# Altium footprint library Connector_Samtec_HLE_SMD.PcbLib: 290 footprints (part 11 of 24)
Each footprint in its own frame and in the unit in brackets; x right, y up, seen from the top. Pads: shape width x height; smd on the part's side, far side on the other; paste and mask are expansions set on the pad; w line width, h text height; cw(c..) or ccw(c..) is an arc to the next point about the centre after c.
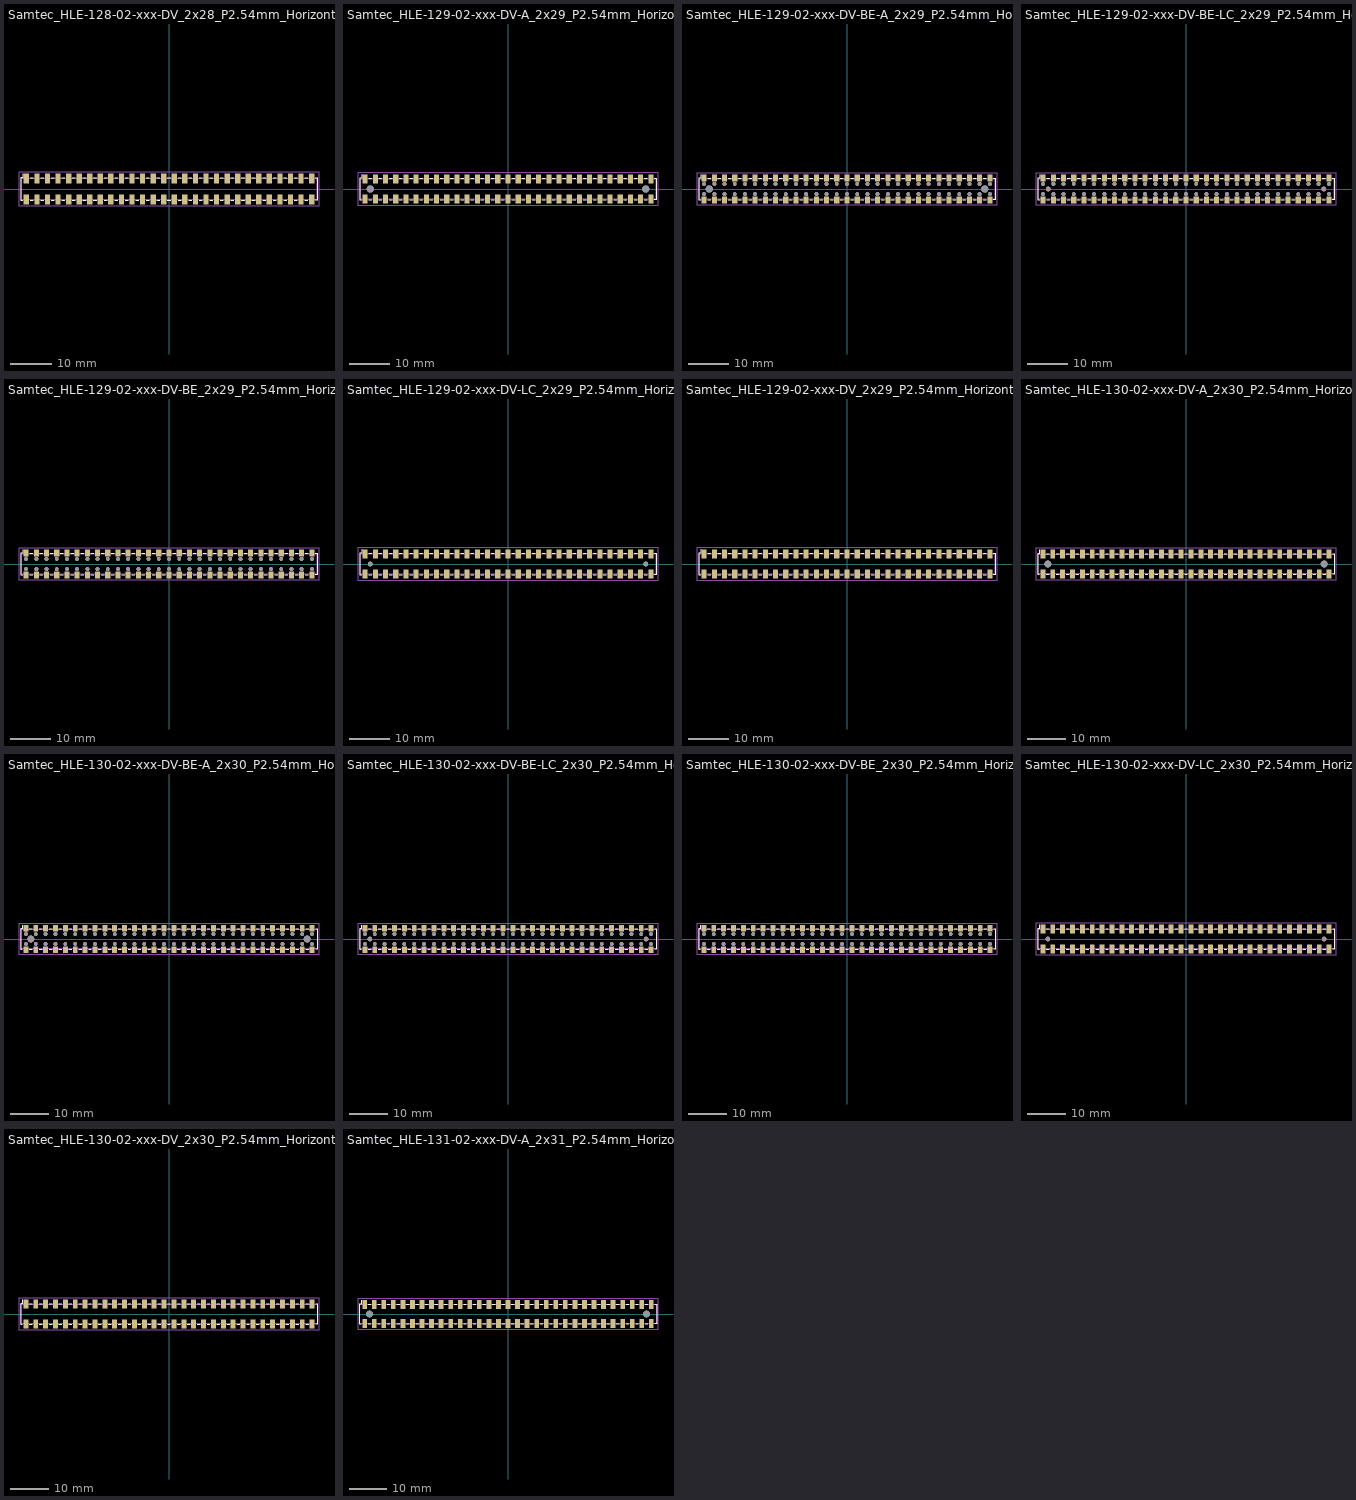
[diagram p10: the footprints below, top view; thin cyan lines are the x and y axes]

## Samtec_HLE-128-02-xxx-DV_2x28_P2.54mm_Horizontal [mm]
pads (56):
  rect 1.27x2.29 smd: 1(-34.29,2.525) 2(-34.29,-2.525) 3(-31.75,2.525) 4(-31.75,-2.525) 5(-29.21,2.525) 6(-29.21,-2.525) 7(-26.67,2.525) 8(-26.67,-2.525) 9(-24.13,2.525) 10(-24.13,-2.525) 11(-21.59,2.525) 12(-21.59,-2.525) 13(-19.05,2.525) 14(-19.05,-2.525) 15(-16.51,2.525) 16(-16.51,-2.525) 17(-13.97,2.525) 18(-13.97,-2.525) 19(-11.43,2.525) 20(-11.43,-2.525) 21(-8.89,2.525) 22(-8.89,-2.525) 23(-6.35,2.525) 24(-6.35,-2.525) 25(-3.81,2.525) 26(-3.81,-2.525) 27(-1.27,2.525) 28(-1.27,-2.525) 29(1.27,2.525) 30(1.27,-2.525) 31(3.81,2.525) 32(3.81,-2.525) 33(6.35,2.525) 34(6.35,-2.525) 35(8.89,2.525) 36(8.89,-2.525) 37(11.43,2.525) 38(11.43,-2.525) 39(13.97,2.525) 40(13.97,-2.525) 41(16.51,2.525) 42(16.51,-2.525) 43(19.05,2.525) 44(19.05,-2.525) 45(21.59,2.525) 46(21.59,-2.525) 47(24.13,2.525) 48(24.13,-2.525) 49(26.67,2.525) 50(26.67,-2.525) 51(29.21,2.525) 52(29.21,-2.525) 53(31.75,2.525) 54(31.75,-2.525) 55(34.29,2.525) 56(34.29,-2.525)
F.SilkS:
  lines w0.12: -35.185,-2.65 -35.67,-2.65 -35.67,2.65 -35.185,2.65 -35.185,3.67 ; -33.395,-2.65 -32.645,-2.65 ; -33.395,2.65 -32.645,2.65 ; -30.855,-2.65 -30.105,-2.65 ; -30.855,2.65 -30.105,2.65 ; -28.315,-2.65 -27.565,-2.65 ; -28.315,2.65 -27.565,2.65 ; -25.775,-2.65 -25.025,-2.65 ; -25.775,2.65 -25.025,2.65 ; -23.235,-2.65 -22.485,-2.65 ; -23.235,2.65 -22.485,2.65 ; -20.695,-2.65 -19.945,-2.65 ; -20.695,2.65 -19.945,2.65 ; -18.155,-2.65 -17.405,-2.65 ; -18.155,2.65 -17.405,2.65 ; -15.615,-2.65 -14.865,-2.65 ; -15.615,2.65 -14.865,2.65 ; -13.075,-2.65 -12.325,-2.65 ; -13.075,2.65 -12.325,2.65 ; -10.535,-2.65 -9.785,-2.65 ; -10.535,2.65 -9.785,2.65 ; -7.995,-2.65 -7.245,-2.65 ; -7.995,2.65 -7.245,2.65 ; -5.455,-2.65 -4.705,-2.65 ; -5.455,2.65 -4.705,2.65 ; -2.915,-2.65 -2.165,-2.65 ; -2.915,2.65 -2.165,2.65 ; -0.375,-2.65 0.375,-2.65 ; -0.375,2.65 0.375,2.65 ; 2.165,-2.65 2.915,-2.65 ; 2.165,2.65 2.915,2.65 ; 4.705,-2.65 5.455,-2.65 ; 4.705,2.65 5.455,2.65 ; 7.245,-2.65 7.995,-2.65 ; 7.245,2.65 7.995,2.65 ; 9.785,-2.65 10.535,-2.65 ; 9.785,2.65 10.535,2.65 ; 12.325,-2.65 13.075,-2.65 ; 12.325,2.65 13.075,2.65 ; 14.865,-2.65 15.615,-2.65 ; 14.865,2.65 15.615,2.65 ; 17.405,-2.65 18.155,-2.65 ; 17.405,2.65 18.155,2.65 ; 19.945,-2.65 20.695,-2.65 ; 19.945,2.65 20.695,2.65 ; 22.485,-2.65 23.235,-2.65 ; 22.485,2.65 23.235,2.65 ; 25.025,-2.65 25.775,-2.65 ; 25.025,2.65 25.775,2.65 ; 27.565,-2.65 28.315,-2.65 ; 27.565,2.65 28.315,2.65 ; 30.105,-2.65 30.855,-2.65 ; 30.105,2.65 30.855,2.65 ; 32.645,-2.65 33.395,-2.65 ; 32.645,2.65 33.395,2.65 ; 35.185,-2.65 35.67,-2.65 35.67,2.65 35.185,2.65
F.CrtYd:
  lines w0.05: -36.06,-4.17 -36.06,4.17 36.06,4.17 36.06,-4.17 -36.06,-4.17
F.Fab:
  lines w0.1: -34.79,2.54 -34.29,1.833 -33.79,2.54 ; -35.56,-2.54 35.56,-2.54 35.56,2.54 -35.56,2.54 -35.56,-2.54
  text "'.Designator'" at -4.047,-2.68 h1

## Samtec_HLE-129-02-xxx-DV-A_2x29_P2.54mm_Horizontal [mm]
pads (60):
  rect 1.27x2.29 smd: 1(-35.56,2.525) 2(-35.56,-2.525) 3(-33.02,2.525) 4(-33.02,-2.525) 5(-30.48,2.525) 6(-30.48,-2.525) 7(-27.94,2.525) 8(-27.94,-2.525) 9(-25.4,2.525) 10(-25.4,-2.525) 11(-22.86,2.525) 12(-22.86,-2.525) 13(-20.32,2.525) 14(-20.32,-2.525) 15(-17.78,2.525) 16(-17.78,-2.525) 17(-15.24,2.525) 18(-15.24,-2.525) 19(-12.7,2.525) 20(-12.7,-2.525) 21(-10.16,2.525) 22(-10.16,-2.525) 23(-7.62,2.525) 24(-7.62,-2.525) 25(-5.08,2.525) 26(-5.08,-2.525) 27(-2.54,2.525) 28(-2.54,-2.525) 29(0,2.525) 30(0,-2.525) 31(2.54,2.525) 32(2.54,-2.525) 33(5.08,2.525) 34(5.08,-2.525) 35(7.62,2.525) 36(7.62,-2.525) 37(10.16,2.525) 38(10.16,-2.525) 39(12.7,2.525) 40(12.7,-2.525) 41(15.24,2.525) 42(15.24,-2.525) 43(17.78,2.525) 44(17.78,-2.525) 45(20.32,2.525) 46(20.32,-2.525) 47(22.86,2.525) 48(22.86,-2.525) 49(25.4,2.525) 50(25.4,-2.525) 51(27.94,2.525) 52(27.94,-2.525) 53(30.48,2.525) 54(30.48,-2.525) 55(33.02,2.525) 56(33.02,-2.525) 57(35.56,2.525) 58(35.56,-2.525)
  round 1.78 hole 1.78: Un1(34.29,0) Un2(-34.29,0)
F.SilkS:
  lines w0.12: -36.455,-2.65 -36.94,-2.65 -36.94,2.65 -36.455,2.65 -36.455,3.67 ; -34.665,-2.65 -33.915,-2.65 ; -34.665,2.65 -33.915,2.65 ; -32.125,-2.65 -31.375,-2.65 ; -32.125,2.65 -31.375,2.65 ; -29.585,-2.65 -28.835,-2.65 ; -29.585,2.65 -28.835,2.65 ; -27.045,-2.65 -26.295,-2.65 ; -27.045,2.65 -26.295,2.65 ; -24.505,-2.65 -23.755,-2.65 ; -24.505,2.65 -23.755,2.65 ; -21.965,-2.65 -21.215,-2.65 ; -21.965,2.65 -21.215,2.65 ; -19.425,-2.65 -18.675,-2.65 ; -19.425,2.65 -18.675,2.65 ; -16.885,-2.65 -16.135,-2.65 ; -16.885,2.65 -16.135,2.65 ; -14.345,-2.65 -13.595,-2.65 ; -14.345,2.65 -13.595,2.65 ; -11.805,-2.65 -11.055,-2.65 ; -11.805,2.65 -11.055,2.65 ; -9.265,-2.65 -8.515,-2.65 ; -9.265,2.65 -8.515,2.65 ; -6.725,-2.65 -5.975,-2.65 ; -6.725,2.65 -5.975,2.65 ; -4.185,-2.65 -3.435,-2.65 ; -4.185,2.65 -3.435,2.65 ; -1.645,-2.65 -0.895,-2.65 ; -1.645,2.65 -0.895,2.65 ; 0.895,-2.65 1.645,-2.65 ; 0.895,2.65 1.645,2.65 ; 3.435,-2.65 4.185,-2.65 ; 3.435,2.65 4.185,2.65 ; 5.975,-2.65 6.725,-2.65 ; 5.975,2.65 6.725,2.65 ; 8.515,-2.65 9.265,-2.65 ; 8.515,2.65 9.265,2.65 ; 11.055,-2.65 11.805,-2.65 ; 11.055,2.65 11.805,2.65 ; 13.595,-2.65 14.345,-2.65 ; 13.595,2.65 14.345,2.65 ; 16.135,-2.65 16.885,-2.65 ; 16.135,2.65 16.885,2.65 ; 18.675,-2.65 19.425,-2.65 ; 18.675,2.65 19.425,2.65 ; 21.215,-2.65 21.965,-2.65 ; 21.215,2.65 21.965,2.65 ; 23.755,-2.65 24.505,-2.65 ; 23.755,2.65 24.505,2.65 ; 26.295,-2.65 27.045,-2.65 ; 26.295,2.65 27.045,2.65 ; 28.835,-2.65 29.585,-2.65 ; 28.835,2.65 29.585,2.65 ; 31.375,-2.65 32.125,-2.65 ; 31.375,2.65 32.125,2.65 ; 33.915,-2.65 34.665,-2.65 ; 33.915,2.65 34.665,2.65 ; 36.455,-2.65 36.94,-2.65 36.94,2.65 36.455,2.65
F.CrtYd:
  lines w0.05: -37.33,-4.17 37.33,-4.17 37.33,4.17 -37.33,4.17 -37.33,-4.17
F.Fab:
  lines w0.1: -36.06,2.54 -35.56,1.833 -35.06,2.54 ; -36.83,-2.54 -36.83,2.54 36.83,2.54 36.83,-2.54 -36.83,-2.54
  text "'.Designator'" at -4.047,-2.68 h1

## Samtec_HLE-129-02-xxx-DV-BE-A_2x29_P2.54mm_Horizontal [mm]
pads (118):
  rect 1.27x1.68 smd: 1(-35.56,2.72) 2(-35.56,-2.72) 3(-33.02,2.72) 4(-33.02,-2.72) 5(-30.48,2.72) 6(-30.48,-2.72) 7(-27.94,2.72) 8(-27.94,-2.72) 9(-25.4,2.72) 10(-25.4,-2.72) 11(-22.86,2.72) 12(-22.86,-2.72) 13(-20.32,2.72) 14(-20.32,-2.72) 15(-17.78,2.72) 16(-17.78,-2.72) 17(-15.24,2.72) 18(-15.24,-2.72) 19(-12.7,2.72) 20(-12.7,-2.72) 21(-10.16,2.72) 22(-10.16,-2.72) 23(-7.62,2.72) 24(-7.62,-2.72) 25(-5.08,2.72) 26(-5.08,-2.72) 27(-2.54,2.72) 28(-2.54,-2.72) 29(0,2.72) 30(0,-2.72) 31(2.54,2.72) 32(2.54,-2.72) 33(5.08,2.72) 34(5.08,-2.72) 35(7.62,2.72) 36(7.62,-2.72) 37(10.16,2.72) 38(10.16,-2.72) 39(12.7,2.72) 40(12.7,-2.72) 41(15.24,2.72) 42(15.24,-2.72) 43(17.78,2.72) 44(17.78,-2.72) 45(20.32,2.72) 46(20.32,-2.72) 47(22.86,2.72) 48(22.86,-2.72) 49(25.4,2.72) 50(25.4,-2.72) 51(27.94,2.72) 52(27.94,-2.72) 53(30.48,2.72) 54(30.48,-2.72) 55(33.02,2.72) 56(33.02,-2.72) 57(35.56,2.72) 58(35.56,-2.72)
  round 0.97 hole 0.97: Un1(20.32,1.27) Un2(-30.48,1.27) Un3(35.56,1.27) Un4(33.02,1.27) Un5(-10.16,1.27) Un6(17.78,-1.27) Un7(27.94,-1.27) Un8(25.4,-1.27) Un9(2.54,-1.27) Un10(30.48,-1.27) Un11(-27.94,1.27) Un12(-7.62,1.27) Un13(25.4,1.27) Un14(10.16,-1.27) Un15(7.62,1.27) Un16(-5.08,-1.27) Un18(27.94,1.27) Un19(20.32,-1.27) Un20(35.56,-1.27) Un21(-5.08,1.27) Un22(-2.54,-1.27) Un23(12.7,1.27) Un24(-20.32,1.27) Un26(-25.4,1.27) Un27(-15.24,-1.27) Un28(15.24,-1.27) Un29(-30.48,-1.27) Un30(-22.86,-1.27) Un31(-17.78,-1.27) Un32(17.78,1.27) Un33(-12.7,1.27) Un34(15.24,1.27) Un35(-22.86,1.27) Un36(-10.16,-1.27) Un37(22.86,-1.27) Un38(-33.02,-1.27) Un39(30.48,1.27) Un40(2.54,1.27) Un41(0,-1.27) Un42(-15.24,1.27) Un43(-2.54,1.27) Un44(5.08,-1.27) Un45(-35.56,-1.27) Un46(-17.78,1.27) Un47(0,1.27) Un48(7.62,-1.27) Un49(-33.02,1.27) Un50(-7.62,-1.27) Un51(-20.32,-1.27) Un52(5.08,1.27) Un53(-27.94,-1.27) Un54(12.7,-1.27) Un55(-25.4,-1.27) Un56(22.86,1.27) Un57(-35.56,1.27) Un58(-12.7,-1.27) Un59(10.16,1.27) Un60(33.02,-1.27)
  round 1.78 hole 1.78: Un17(34.29,0) Un25(-34.29,0)
F.SilkS:
  lines w0.12: -36.455,-2.65 -36.94,-2.65 -36.94,2.65 -36.455,2.65 -36.455,3.56 ; -34.665,-2.65 -33.915,-2.65 ; -34.665,2.65 -33.915,2.65 ; -32.125,-2.65 -31.375,-2.65 ; -32.125,2.65 -31.375,2.65 ; -29.585,-2.65 -28.835,-2.65 ; -29.585,2.65 -28.835,2.65 ; -27.045,-2.65 -26.295,-2.65 ; -27.045,2.65 -26.295,2.65 ; -24.505,-2.65 -23.755,-2.65 ; -24.505,2.65 -23.755,2.65 ; -21.965,-2.65 -21.215,-2.65 ; -21.965,2.65 -21.215,2.65 ; -19.425,-2.65 -18.675,-2.65 ; -19.425,2.65 -18.675,2.65 ; -16.885,-2.65 -16.135,-2.65 ; -16.885,2.65 -16.135,2.65 ; -14.345,-2.65 -13.595,-2.65 ; -14.345,2.65 -13.595,2.65 ; -11.805,-2.65 -11.055,-2.65 ; -11.805,2.65 -11.055,2.65 ; -9.265,-2.65 -8.515,-2.65 ; -9.265,2.65 -8.515,2.65 ; -6.725,-2.65 -5.975,-2.65 ; -6.725,2.65 -5.975,2.65 ; -4.185,-2.65 -3.435,-2.65 ; -4.185,2.65 -3.435,2.65 ; -1.645,-2.65 -0.895,-2.65 ; -1.645,2.65 -0.895,2.65 ; 0.895,-2.65 1.645,-2.65 ; 0.895,2.65 1.645,2.65 ; 3.435,-2.65 4.185,-2.65 ; 3.435,2.65 4.185,2.65 ; 5.975,-2.65 6.725,-2.65 ; 5.975,2.65 6.725,2.65 ; 8.515,-2.65 9.265,-2.65 ; 8.515,2.65 9.265,2.65 ; 11.055,-2.65 11.805,-2.65 ; 11.055,2.65 11.805,2.65 ; 13.595,-2.65 14.345,-2.65 ; 13.595,2.65 14.345,2.65 ; 16.135,-2.65 16.885,-2.65 ; 16.135,2.65 16.885,2.65 ; 18.675,-2.65 19.425,-2.65 ; 18.675,2.65 19.425,2.65 ; 21.215,-2.65 21.965,-2.65 ; 21.215,2.65 21.965,2.65 ; 23.755,-2.65 24.505,-2.65 ; 23.755,2.65 24.505,2.65 ; 26.295,-2.65 27.045,-2.65 ; 26.295,2.65 27.045,2.65 ; 28.835,-2.65 29.585,-2.65 ; 28.835,2.65 29.585,2.65 ; 31.375,-2.65 32.125,-2.65 ; 31.375,2.65 32.125,2.65 ; 33.915,-2.65 34.665,-2.65 ; 33.915,2.65 34.665,2.65 ; 36.455,-2.65 36.94,-2.65 36.94,2.65 36.455,2.65
F.CrtYd:
  lines w0.05: -37.33,-4.06 37.33,-4.06 37.33,4.06 -37.33,4.06 -37.33,-4.06
F.Fab:
  lines w0.1: -36.06,2.54 -35.56,1.833 -35.06,2.54 ; -36.83,-2.54 36.83,-2.54 36.83,2.54 -36.83,2.54 -36.83,-2.54
  text "'.Designator'" at -4.047,-2.68 h1

## Samtec_HLE-129-02-xxx-DV-BE-LC_2x29_P2.54mm_Horizontal [mm]
pads (118):
  rect 1.27x1.68 smd: 1(-35.56,2.72) 2(-35.56,-2.72) 3(-33.02,2.72) 4(-33.02,-2.72) 5(-30.48,2.72) 6(-30.48,-2.72) 7(-27.94,2.72) 8(-27.94,-2.72) 9(-25.4,2.72) 10(-25.4,-2.72) 11(-22.86,2.72) 12(-22.86,-2.72) 13(-20.32,2.72) 14(-20.32,-2.72) 15(-17.78,2.72) 16(-17.78,-2.72) 17(-15.24,2.72) 18(-15.24,-2.72) 19(-12.7,2.72) 20(-12.7,-2.72) 21(-10.16,2.72) 22(-10.16,-2.72) 23(-7.62,2.72) 24(-7.62,-2.72) 25(-5.08,2.72) 26(-5.08,-2.72) 27(-2.54,2.72) 28(-2.54,-2.72) 29(0,2.72) 30(0,-2.72) 31(2.54,2.72) 32(2.54,-2.72) 33(5.08,2.72) 34(5.08,-2.72) 35(7.62,2.72) 36(7.62,-2.72) 37(10.16,2.72) 38(10.16,-2.72) 39(12.7,2.72) 40(12.7,-2.72) 41(15.24,2.72) 42(15.24,-2.72) 43(17.78,2.72) 44(17.78,-2.72) 45(20.32,2.72) 46(20.32,-2.72) 47(22.86,2.72) 48(22.86,-2.72) 49(25.4,2.72) 50(25.4,-2.72) 51(27.94,2.72) 52(27.94,-2.72) 53(30.48,2.72) 54(30.48,-2.72) 55(33.02,2.72) 56(33.02,-2.72) 57(35.56,2.72) 58(35.56,-2.72)
  round 0.97 hole 0.97: Un1(20.32,-1.27) Un2(-17.78,-1.27) Un3(7.62,-1.27) Un4(-27.94,1.27) Un5(25.4,1.27) Un6(-27.94,-1.27) Un7(-7.62,-1.27) Un8(-30.48,1.27) Un9(2.54,-1.27) Un10(17.78,1.27) Un11(35.56,-1.27) Un12(-25.4,-1.27) Un13(-12.7,-1.27) Un14(30.48,1.27) Un15(27.94,1.27) Un16(-15.24,1.27) Un17(-2.54,1.27) Un18(33.02,-1.27) Un19(10.16,1.27) Un20(5.08,1.27) Un21(-10.16,1.27) Un22(-12.7,1.27) Un23(-15.24,-1.27) Un24(-17.78,1.27) Un25(27.94,-1.27) Un26(15.24,-1.27) Un27(-25.4,1.27) Un28(22.86,1.27) Un29(5.08,-1.27) Un30(-7.62,1.27) Un31(12.7,1.27) Un32(-33.02,1.27) Un33(-35.56,-1.27) Un34(15.24,1.27) Un35(-22.86,-1.27) Un36(33.02,1.27) Un38(-5.08,1.27) Un39(22.86,-1.27) Un40(-33.02,-1.27) Un41(-20.32,-1.27) Un42(25.4,-1.27) Un43(-20.32,1.27) Un44(0,-1.27) Un45(-30.48,-1.27) Un46(2.54,1.27) Un47(10.16,-1.27) Un48(30.48,-1.27) Un49(20.32,1.27) Un50(17.78,-1.27) Un51(7.62,1.27) Un52(0,1.27) Un53(-10.16,-1.27) Un54(-22.86,1.27) Un55(-5.08,-1.27) Un56(-35.56,1.27) Un57(35.56,1.27) Un59(-2.54,-1.27) Un60(12.7,-1.27)
  round 1.19 hole 1.19: Un37(34.29,0) Un58(-34.29,0)
F.SilkS:
  lines w0.12: -36.455,-2.65 -36.94,-2.65 -36.94,2.65 -36.455,2.65 -36.455,3.56 ; -34.665,-2.65 -33.915,-2.65 ; -34.665,2.65 -33.915,2.65 ; -32.125,-2.65 -31.375,-2.65 ; -32.125,2.65 -31.375,2.65 ; -29.585,-2.65 -28.835,-2.65 ; -29.585,2.65 -28.835,2.65 ; -27.045,-2.65 -26.295,-2.65 ; -27.045,2.65 -26.295,2.65 ; -24.505,-2.65 -23.755,-2.65 ; -24.505,2.65 -23.755,2.65 ; -21.965,-2.65 -21.215,-2.65 ; -21.965,2.65 -21.215,2.65 ; -19.425,-2.65 -18.675,-2.65 ; -19.425,2.65 -18.675,2.65 ; -16.885,-2.65 -16.135,-2.65 ; -16.885,2.65 -16.135,2.65 ; -14.345,-2.65 -13.595,-2.65 ; -14.345,2.65 -13.595,2.65 ; -11.805,-2.65 -11.055,-2.65 ; -11.805,2.65 -11.055,2.65 ; -9.265,-2.65 -8.515,-2.65 ; -9.265,2.65 -8.515,2.65 ; -6.725,-2.65 -5.975,-2.65 ; -6.725,2.65 -5.975,2.65 ; -4.185,-2.65 -3.435,-2.65 ; -4.185,2.65 -3.435,2.65 ; -1.645,-2.65 -0.895,-2.65 ; -1.645,2.65 -0.895,2.65 ; 0.895,-2.65 1.645,-2.65 ; 0.895,2.65 1.645,2.65 ; 3.435,-2.65 4.185,-2.65 ; 3.435,2.65 4.185,2.65 ; 5.975,-2.65 6.725,-2.65 ; 5.975,2.65 6.725,2.65 ; 8.515,-2.65 9.265,-2.65 ; 8.515,2.65 9.265,2.65 ; 11.055,-2.65 11.805,-2.65 ; 11.055,2.65 11.805,2.65 ; 13.595,-2.65 14.345,-2.65 ; 13.595,2.65 14.345,2.65 ; 16.135,-2.65 16.885,-2.65 ; 16.135,2.65 16.885,2.65 ; 18.675,-2.65 19.425,-2.65 ; 18.675,2.65 19.425,2.65 ; 21.215,-2.65 21.965,-2.65 ; 21.215,2.65 21.965,2.65 ; 23.755,-2.65 24.505,-2.65 ; 23.755,2.65 24.505,2.65 ; 26.295,-2.65 27.045,-2.65 ; 26.295,2.65 27.045,2.65 ; 28.835,-2.65 29.585,-2.65 ; 28.835,2.65 29.585,2.65 ; 31.375,-2.65 32.125,-2.65 ; 31.375,2.65 32.125,2.65 ; 33.915,-2.65 34.665,-2.65 ; 33.915,2.65 34.665,2.65 ; 36.455,-2.65 36.94,-2.65 36.94,2.65 36.455,2.65
F.CrtYd:
  lines w0.05: -37.33,-4.06 -37.33,4.06 37.33,4.06 37.33,-4.06 -37.33,-4.06
F.Fab:
  lines w0.1: -36.06,2.54 -35.56,1.833 -35.06,2.54 ; -36.83,-2.54 -36.83,2.54 36.83,2.54 36.83,-2.54 -36.83,-2.54
  text "'.Designator'" at -4.047,-2.68 h1

## Samtec_HLE-129-02-xxx-DV-BE_2x29_P2.54mm_Horizontal [mm]
pads (116):
  rect 1.27x1.68 smd: 1(-35.56,2.72) 2(-35.56,-2.72) 3(-33.02,2.72) 4(-33.02,-2.72) 5(-30.48,2.72) 6(-30.48,-2.72) 7(-27.94,2.72) 8(-27.94,-2.72) 9(-25.4,2.72) 10(-25.4,-2.72) 11(-22.86,2.72) 12(-22.86,-2.72) 13(-20.32,2.72) 14(-20.32,-2.72) 15(-17.78,2.72) 16(-17.78,-2.72) 17(-15.24,2.72) 18(-15.24,-2.72) 19(-12.7,2.72) 20(-12.7,-2.72) 21(-10.16,2.72) 22(-10.16,-2.72) 23(-7.62,2.72) 24(-7.62,-2.72) 25(-5.08,2.72) 26(-5.08,-2.72) 27(-2.54,2.72) 28(-2.54,-2.72) 29(0,2.72) 30(0,-2.72) 31(2.54,2.72) 32(2.54,-2.72) 33(5.08,2.72) 34(5.08,-2.72) 35(7.62,2.72) 36(7.62,-2.72) 37(10.16,2.72) 38(10.16,-2.72) 39(12.7,2.72) 40(12.7,-2.72) 41(15.24,2.72) 42(15.24,-2.72) 43(17.78,2.72) 44(17.78,-2.72) 45(20.32,2.72) 46(20.32,-2.72) 47(22.86,2.72) 48(22.86,-2.72) 49(25.4,2.72) 50(25.4,-2.72) 51(27.94,2.72) 52(27.94,-2.72) 53(30.48,2.72) 54(30.48,-2.72) 55(33.02,2.72) 56(33.02,-2.72) 57(35.56,2.72) 58(35.56,-2.72)
  round 0.97 hole 0.97: Un1(-17.78,1.27) Un2(30.48,-1.27) Un3(-27.94,1.27) Un4(20.32,-1.27) Un5(25.4,-1.27) Un6(-7.62,-1.27) Un7(2.54,-1.27) Un8(-22.86,-1.27) Un9(27.94,-1.27) Un10(5.08,1.27) Un11(-35.56,1.27) Un12(7.62,1.27) Un13(33.02,1.27) Un14(33.02,-1.27) Un15(25.4,1.27) Un16(-15.24,1.27) Un17(27.94,1.27) Un18(-35.56,-1.27) Un19(-20.32,1.27) Un20(17.78,-1.27) Un21(20.32,1.27) Un22(-12.7,-1.27) Un23(-5.08,1.27) Un24(22.86,1.27) Un25(-30.48,-1.27) Un26(-22.86,1.27) Un27(12.7,1.27) Un28(2.54,1.27) Un29(-33.02,-1.27) Un30(-10.16,-1.27) Un31(-7.62,1.27) Un32(5.08,-1.27) Un33(15.24,-1.27) Un34(15.24,1.27) Un35(30.48,1.27) Un36(35.56,-1.27) Un37(10.16,-1.27) Un38(0,1.27) Un39(-12.7,1.27) Un40(7.62,-1.27) Un41(-20.32,-1.27) Un42(10.16,1.27) Un43(-17.78,-1.27) Un44(-30.48,1.27) Un45(-27.94,-1.27) Un46(-25.4,1.27) Un47(0,-1.27) Un48(-25.4,-1.27) Un49(17.78,1.27) Un50(-15.24,-1.27) Un51(-2.54,1.27) Un52(22.86,-1.27) Un53(12.7,-1.27) Un54(35.56,1.27) Un55(-10.16,1.27) Un56(-2.54,-1.27) Un57(-33.02,1.27) Un58(-5.08,-1.27)
F.SilkS:
  lines w0.12: -36.455,-2.65 -36.94,-2.65 -36.94,2.65 -36.455,2.65 -36.455,3.56 ; -34.665,-2.65 -33.915,-2.65 ; -34.665,2.65 -33.915,2.65 ; -32.125,-2.65 -31.375,-2.65 ; -32.125,2.65 -31.375,2.65 ; -29.585,-2.65 -28.835,-2.65 ; -29.585,2.65 -28.835,2.65 ; -27.045,-2.65 -26.295,-2.65 ; -27.045,2.65 -26.295,2.65 ; -24.505,-2.65 -23.755,-2.65 ; -24.505,2.65 -23.755,2.65 ; -21.965,-2.65 -21.215,-2.65 ; -21.965,2.65 -21.215,2.65 ; -19.425,-2.65 -18.675,-2.65 ; -19.425,2.65 -18.675,2.65 ; -16.885,-2.65 -16.135,-2.65 ; -16.885,2.65 -16.135,2.65 ; -14.345,-2.65 -13.595,-2.65 ; -14.345,2.65 -13.595,2.65 ; -11.805,-2.65 -11.055,-2.65 ; -11.805,2.65 -11.055,2.65 ; -9.265,-2.65 -8.515,-2.65 ; -9.265,2.65 -8.515,2.65 ; -6.725,-2.65 -5.975,-2.65 ; -6.725,2.65 -5.975,2.65 ; -4.185,-2.65 -3.435,-2.65 ; -4.185,2.65 -3.435,2.65 ; -1.645,-2.65 -0.895,-2.65 ; -1.645,2.65 -0.895,2.65 ; 0.895,-2.65 1.645,-2.65 ; 0.895,2.65 1.645,2.65 ; 3.435,-2.65 4.185,-2.65 ; 3.435,2.65 4.185,2.65 ; 5.975,-2.65 6.725,-2.65 ; 5.975,2.65 6.725,2.65 ; 8.515,-2.65 9.265,-2.65 ; 8.515,2.65 9.265,2.65 ; 11.055,-2.65 11.805,-2.65 ; 11.055,2.65 11.805,2.65 ; 13.595,-2.65 14.345,-2.65 ; 13.595,2.65 14.345,2.65 ; 16.135,-2.65 16.885,-2.65 ; 16.135,2.65 16.885,2.65 ; 18.675,-2.65 19.425,-2.65 ; 18.675,2.65 19.425,2.65 ; 21.215,-2.65 21.965,-2.65 ; 21.215,2.65 21.965,2.65 ; 23.755,-2.65 24.505,-2.65 ; 23.755,2.65 24.505,2.65 ; 26.295,-2.65 27.045,-2.65 ; 26.295,2.65 27.045,2.65 ; 28.835,-2.65 29.585,-2.65 ; 28.835,2.65 29.585,2.65 ; 31.375,-2.65 32.125,-2.65 ; 31.375,2.65 32.125,2.65 ; 33.915,-2.65 34.665,-2.65 ; 33.915,2.65 34.665,2.65 ; 36.455,-2.65 36.94,-2.65 36.94,2.65 36.455,2.65
F.CrtYd:
  lines w0.05: -37.33,-4.06 37.33,-4.06 37.33,4.06 -37.33,4.06 -37.33,-4.06
F.Fab:
  lines w0.1: -36.06,2.54 -35.56,1.833 -35.06,2.54 ; -36.83,-2.54 36.83,-2.54 36.83,2.54 -36.83,2.54 -36.83,-2.54
  text "'.Designator'" at -4.047,-2.68 h1

## Samtec_HLE-129-02-xxx-DV-LC_2x29_P2.54mm_Horizontal [mm]
pads (60):
  rect 1.27x2.29 smd: 1(-35.56,2.525) 2(-35.56,-2.525) 3(-33.02,2.525) 4(-33.02,-2.525) 5(-30.48,2.525) 6(-30.48,-2.525) 7(-27.94,2.525) 8(-27.94,-2.525) 9(-25.4,2.525) 10(-25.4,-2.525) 11(-22.86,2.525) 12(-22.86,-2.525) 13(-20.32,2.525) 14(-20.32,-2.525) 15(-17.78,2.525) 16(-17.78,-2.525) 17(-15.24,2.525) 18(-15.24,-2.525) 19(-12.7,2.525) 20(-12.7,-2.525) 21(-10.16,2.525) 22(-10.16,-2.525) 23(-7.62,2.525) 24(-7.62,-2.525) 25(-5.08,2.525) 26(-5.08,-2.525) 27(-2.54,2.525) 28(-2.54,-2.525) 29(0,2.525) 30(0,-2.525) 31(2.54,2.525) 32(2.54,-2.525) 33(5.08,2.525) 34(5.08,-2.525) 35(7.62,2.525) 36(7.62,-2.525) 37(10.16,2.525) 38(10.16,-2.525) 39(12.7,2.525) 40(12.7,-2.525) 41(15.24,2.525) 42(15.24,-2.525) 43(17.78,2.525) 44(17.78,-2.525) 45(20.32,2.525) 46(20.32,-2.525) 47(22.86,2.525) 48(22.86,-2.525) 49(25.4,2.525) 50(25.4,-2.525) 51(27.94,2.525) 52(27.94,-2.525) 53(30.48,2.525) 54(30.48,-2.525) 55(33.02,2.525) 56(33.02,-2.525) 57(35.56,2.525) 58(35.56,-2.525)
  round 1.19 hole 1.19: Un1(-34.29,0) Un2(34.29,0)
F.SilkS:
  lines w0.12: -36.455,-2.65 -36.94,-2.65 -36.94,2.65 -36.455,2.65 -36.455,3.67 ; -34.665,-2.65 -33.915,-2.65 ; -34.665,2.65 -33.915,2.65 ; -32.125,-2.65 -31.375,-2.65 ; -32.125,2.65 -31.375,2.65 ; -29.585,-2.65 -28.835,-2.65 ; -29.585,2.65 -28.835,2.65 ; -27.045,-2.65 -26.295,-2.65 ; -27.045,2.65 -26.295,2.65 ; -24.505,-2.65 -23.755,-2.65 ; -24.505,2.65 -23.755,2.65 ; -21.965,-2.65 -21.215,-2.65 ; -21.965,2.65 -21.215,2.65 ; -19.425,-2.65 -18.675,-2.65 ; -19.425,2.65 -18.675,2.65 ; -16.885,-2.65 -16.135,-2.65 ; -16.885,2.65 -16.135,2.65 ; -14.345,-2.65 -13.595,-2.65 ; -14.345,2.65 -13.595,2.65 ; -11.805,-2.65 -11.055,-2.65 ; -11.805,2.65 -11.055,2.65 ; -9.265,-2.65 -8.515,-2.65 ; -9.265,2.65 -8.515,2.65 ; -6.725,-2.65 -5.975,-2.65 ; -6.725,2.65 -5.975,2.65 ; -4.185,-2.65 -3.435,-2.65 ; -4.185,2.65 -3.435,2.65 ; -1.645,-2.65 -0.895,-2.65 ; -1.645,2.65 -0.895,2.65 ; 0.895,-2.65 1.645,-2.65 ; 0.895,2.65 1.645,2.65 ; 3.435,-2.65 4.185,-2.65 ; 3.435,2.65 4.185,2.65 ; 5.975,-2.65 6.725,-2.65 ; 5.975,2.65 6.725,2.65 ; 8.515,-2.65 9.265,-2.65 ; 8.515,2.65 9.265,2.65 ; 11.055,-2.65 11.805,-2.65 ; 11.055,2.65 11.805,2.65 ; 13.595,-2.65 14.345,-2.65 ; 13.595,2.65 14.345,2.65 ; 16.135,-2.65 16.885,-2.65 ; 16.135,2.65 16.885,2.65 ; 18.675,-2.65 19.425,-2.65 ; 18.675,2.65 19.425,2.65 ; 21.215,-2.65 21.965,-2.65 ; 21.215,2.65 21.965,2.65 ; 23.755,-2.65 24.505,-2.65 ; 23.755,2.65 24.505,2.65 ; 26.295,-2.65 27.045,-2.65 ; 26.295,2.65 27.045,2.65 ; 28.835,-2.65 29.585,-2.65 ; 28.835,2.65 29.585,2.65 ; 31.375,-2.65 32.125,-2.65 ; 31.375,2.65 32.125,2.65 ; 33.915,-2.65 34.665,-2.65 ; 33.915,2.65 34.665,2.65 ; 36.455,-2.65 36.94,-2.65 36.94,2.65 36.455,2.65
F.CrtYd:
  lines w0.05: -37.33,-4.17 37.33,-4.17 37.33,4.17 -37.33,4.17 -37.33,-4.17
F.Fab:
  lines w0.1: -36.06,2.54 -35.56,1.833 -35.06,2.54 ; -36.83,-2.54 36.83,-2.54 36.83,2.54 -36.83,2.54 -36.83,-2.54
  text "'.Designator'" at -4.047,-2.68 h1

## Samtec_HLE-129-02-xxx-DV_2x29_P2.54mm_Horizontal [mm]
pads (58):
  rect 1.27x2.29 smd: 1(-35.56,2.525) 2(-35.56,-2.525) 3(-33.02,2.525) 4(-33.02,-2.525) 5(-30.48,2.525) 6(-30.48,-2.525) 7(-27.94,2.525) 8(-27.94,-2.525) 9(-25.4,2.525) 10(-25.4,-2.525) 11(-22.86,2.525) 12(-22.86,-2.525) 13(-20.32,2.525) 14(-20.32,-2.525) 15(-17.78,2.525) 16(-17.78,-2.525) 17(-15.24,2.525) 18(-15.24,-2.525) 19(-12.7,2.525) 20(-12.7,-2.525) 21(-10.16,2.525) 22(-10.16,-2.525) 23(-7.62,2.525) 24(-7.62,-2.525) 25(-5.08,2.525) 26(-5.08,-2.525) 27(-2.54,2.525) 28(-2.54,-2.525) 29(0,2.525) 30(0,-2.525) 31(2.54,2.525) 32(2.54,-2.525) 33(5.08,2.525) 34(5.08,-2.525) 35(7.62,2.525) 36(7.62,-2.525) 37(10.16,2.525) 38(10.16,-2.525) 39(12.7,2.525) 40(12.7,-2.525) 41(15.24,2.525) 42(15.24,-2.525) 43(17.78,2.525) 44(17.78,-2.525) 45(20.32,2.525) 46(20.32,-2.525) 47(22.86,2.525) 48(22.86,-2.525) 49(25.4,2.525) 50(25.4,-2.525) 51(27.94,2.525) 52(27.94,-2.525) 53(30.48,2.525) 54(30.48,-2.525) 55(33.02,2.525) 56(33.02,-2.525) 57(35.56,2.525) 58(35.56,-2.525)
F.SilkS:
  lines w0.12: -36.455,-2.65 -36.94,-2.65 -36.94,2.65 -36.455,2.65 -36.455,3.67 ; -34.665,-2.65 -33.915,-2.65 ; -34.665,2.65 -33.915,2.65 ; -32.125,-2.65 -31.375,-2.65 ; -32.125,2.65 -31.375,2.65 ; -29.585,-2.65 -28.835,-2.65 ; -29.585,2.65 -28.835,2.65 ; -27.045,-2.65 -26.295,-2.65 ; -27.045,2.65 -26.295,2.65 ; -24.505,-2.65 -23.755,-2.65 ; -24.505,2.65 -23.755,2.65 ; -21.965,-2.65 -21.215,-2.65 ; -21.965,2.65 -21.215,2.65 ; -19.425,-2.65 -18.675,-2.65 ; -19.425,2.65 -18.675,2.65 ; -16.885,-2.65 -16.135,-2.65 ; -16.885,2.65 -16.135,2.65 ; -14.345,-2.65 -13.595,-2.65 ; -14.345,2.65 -13.595,2.65 ; -11.805,-2.65 -11.055,-2.65 ; -11.805,2.65 -11.055,2.65 ; -9.265,-2.65 -8.515,-2.65 ; -9.265,2.65 -8.515,2.65 ; -6.725,-2.65 -5.975,-2.65 ; -6.725,2.65 -5.975,2.65 ; -4.185,-2.65 -3.435,-2.65 ; -4.185,2.65 -3.435,2.65 ; -1.645,-2.65 -0.895,-2.65 ; -1.645,2.65 -0.895,2.65 ; 0.895,-2.65 1.645,-2.65 ; 0.895,2.65 1.645,2.65 ; 3.435,-2.65 4.185,-2.65 ; 3.435,2.65 4.185,2.65 ; 5.975,-2.65 6.725,-2.65 ; 5.975,2.65 6.725,2.65 ; 8.515,-2.65 9.265,-2.65 ; 8.515,2.65 9.265,2.65 ; 11.055,-2.65 11.805,-2.65 ; 11.055,2.65 11.805,2.65 ; 13.595,-2.65 14.345,-2.65 ; 13.595,2.65 14.345,2.65 ; 16.135,-2.65 16.885,-2.65 ; 16.135,2.65 16.885,2.65 ; 18.675,-2.65 19.425,-2.65 ; 18.675,2.65 19.425,2.65 ; 21.215,-2.65 21.965,-2.65 ; 21.215,2.65 21.965,2.65 ; 23.755,-2.65 24.505,-2.65 ; 23.755,2.65 24.505,2.65 ; 26.295,-2.65 27.045,-2.65 ; 26.295,2.65 27.045,2.65 ; 28.835,-2.65 29.585,-2.65 ; 28.835,2.65 29.585,2.65 ; 31.375,-2.65 32.125,-2.65 ; 31.375,2.65 32.125,2.65 ; 33.915,-2.65 34.665,-2.65 ; 33.915,2.65 34.665,2.65 ; 36.455,-2.65 36.94,-2.65 36.94,2.65 36.455,2.65